# Altium footprint library NodeMcu_v3.PcbLib: 1 footprints
Each footprint in its own frame and in the unit in brackets; x right, y up, seen from the top. Pads: shape width x height; smd on the part's side, far side on the other; paste and mask are expansions set on the pad; w line width, h text height; cw(c..) or ccw(c..) is an arc to the next point about the centre after c.
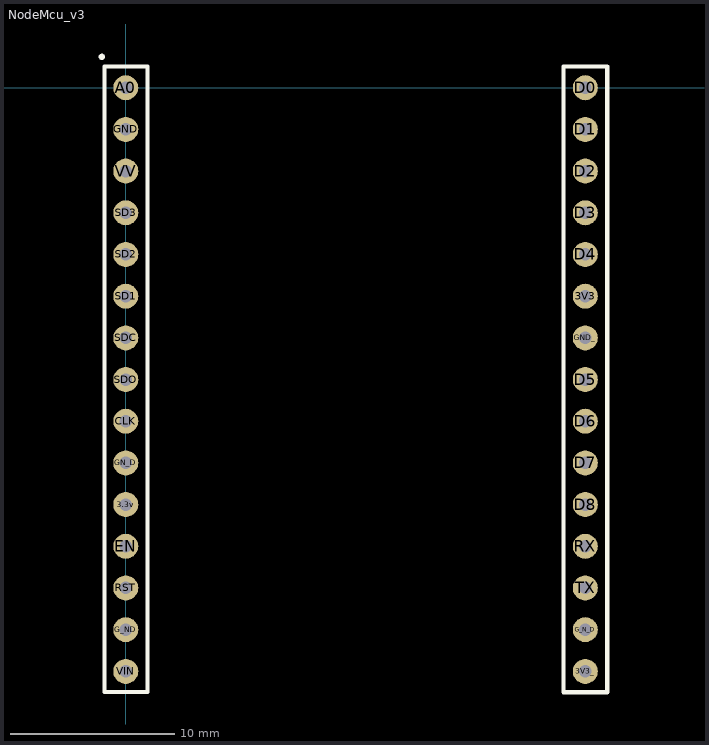
[diagram p0: the footprint, top view; thin cyan lines are the x and y axes]

## NodeMcu_v3 [mil]
pads (30):
  round 60 hole 30: 3.3v(0,-1000) 3V3(1102.36,-500) 3V3_(1102.36,-1400) CLK(0,-800) D0(1102.36,0) D1(1102.36,-100) D2(1102.36,-200) D3(1102.36,-300) D4(1102.36,-400) D5(1102.36,-700) D6(1102.36,-800) D7(1102.36,-900) D8(1102.36,-1000) EN(0,-1100) G_N_D(1102.36,-1300) G_ND(0,-1300) GN_D(0,-900) GND(0,-100) GND_(1102.36,-600) RST(0,-1200) RX(1102.36,-1100) SD1(0,-500) SD2(0,-400) SD3(0,-300) SDC(0,-600) SDO(0,-700) TX(1102.36,-1200) VIN(0,-1400) VV(0,-200)
  round 60 hole 30 paste+0: A0(0,0)
Top Overlay:
  circle w10: c-57.49,74.18 r2.41
  lines w10: -50.76,-1449.42 51.76,-1449.42 51.76,51.22 -50.76,51.22 -50.76,-1449.42 ; 1050.43,-1449.95 1154.92,-1449.95 1154.92,50.91 1050.43,50.91 1050.43,-1449.95
3D body "PinSocket_1x15_P2.54mm_Vertical.step": height 275.59, standoff -122.05, extent -49.99,-1449.99 50.01,50.01
3D body "PinSocket_1x15_P2.54mm_Vertical.step": height 275.59, standoff -122.05, extent 1052.37,-1449.99 1152.37,50.01
3D body "Lolin NodeMCU ESP8266 V3.STEP": height 561.1, standoff 43.78, extent -70.08,-1924.01 1170.08,437.4